# Altium schematic symbol library Resistor - Current Sense.SchLib: 810 symbols (part 3 of 4)
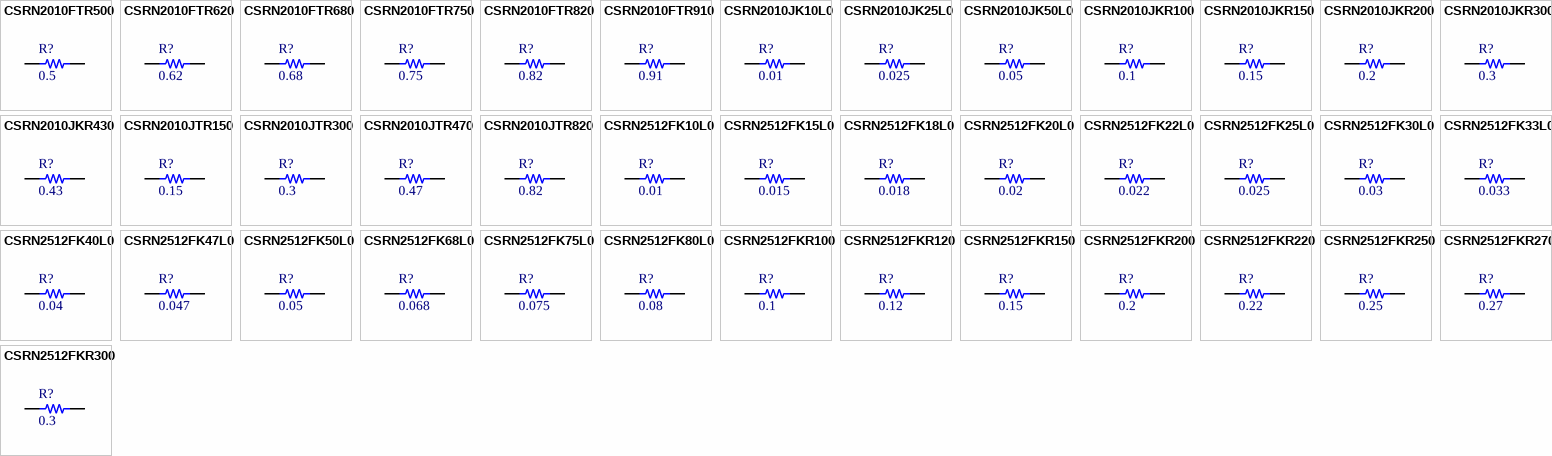
[diagram p22: symbols CSRN2010FTR500 to CSRN2512FKR300]

## CSRN2010FTR500
designator R?, comment 0.5
RES SMD 0.5 OHM 1% 1W 2010; Part Number: CSRN2010FTR500; Manufacturer: Stackpole Electronics Inc.; TemperatureRange: -55C ~ 155C; TemperatureCoefficient: 250ppm/C; Value: 0.5; PartId: 10120; Supplier 1: Digi-Key; Supplier Part Number 1: CSRN2010FTR500-ND; ComponentLink1Description: Datasheet; ComponentLink1URL: http://www.seielect.com/catalog/SEI-CSR_CSRN.pdf; ComponentLink2Description: Digi-Key Listing; ComponentLink2URL: https://www.digikey.com/product-detail/en/stackpole-electronics-inc/CSRN2010FTR500/CSRN2010FTR500-ND/1742703; Tolerance: 1%; PowerRating: 1W; Price: 0.0975; Device Package: 2010 (5025 Metric)
footprint STACKPOLE CSRN2010
pins: 1, 2

## CSRN2010FTR620
designator R?, comment 0.62
RES SMD 0.62 OHM 1% 1W 2010; Part Number: CSRN2010FTR620; Manufacturer: Stackpole Electronics Inc.; TemperatureRange: -55C ~ 155C; TemperatureCoefficient: 250ppm/C; Value: 0.62; PartId: 10121; Supplier 1: Digi-Key; Supplier Part Number 1: CSRN2010FTR620-ND; ComponentLink1Description: Datasheet; ComponentLink1URL: http://www.seielect.com/catalog/SEI-CSR_CSRN.pdf; ComponentLink2Description: Digi-Key Listing; ComponentLink2URL: https://www.digikey.com/product-detail/en/stackpole-electronics-inc/CSRN2010FTR620/CSRN2010FTR620-ND/1742704; Tolerance: 1%; PowerRating: 1W; Price: 0.0975; Device Package: 2010 (5025 Metric)
footprint STACKPOLE CSRN2010
pins: 1, 2

## CSRN2010FTR680
designator R?, comment 0.68
RES SMD 0.68 OHM 1% 1W 2010; Part Number: CSRN2010FTR680; Manufacturer: Stackpole Electronics Inc.; TemperatureRange: -55C ~ 155C; TemperatureCoefficient: 250ppm/C; Value: 0.68; PartId: 10122; Supplier 1: Digi-Key; Supplier Part Number 1: CSRN2010FTR680-ND; ComponentLink1Description: Datasheet; ComponentLink1URL: http://www.seielect.com/catalog/SEI-CSR_CSRN.pdf; ComponentLink2Description: Digi-Key Listing; ComponentLink2URL: https://www.digikey.com/product-detail/en/stackpole-electronics-inc/CSRN2010FTR680/CSRN2010FTR680-ND/1742705; Tolerance: 1%; PowerRating: 1W; Price: 0.0975; Device Package: 2010 (5025 Metric)
footprint STACKPOLE CSRN2010
pins: 1, 2

## CSRN2010FTR750
designator R?, comment 0.75
RES SMD 0.75 OHM 1% 1W 2010; Part Number: CSRN2010FTR750; Manufacturer: Stackpole Electronics Inc.; TemperatureRange: -55C ~ 155C; TemperatureCoefficient: 250ppm/C; Value: 0.75; PartId: 10123; Supplier 1: Digi-Key; Supplier Part Number 1: CSRN2010FTR750-ND; ComponentLink1Description: Datasheet; ComponentLink1URL: http://www.seielect.com/catalog/SEI-CSR_CSRN.pdf; ComponentLink2Description: Digi-Key Listing; ComponentLink2URL: https://www.digikey.com/product-detail/en/stackpole-electronics-inc/CSRN2010FTR750/CSRN2010FTR750-ND/1742706; Tolerance: 1%; PowerRating: 1W; Price: 0.0975; Device Package: 2010 (5025 Metric)
footprint STACKPOLE CSRN2010
pins: 1, 2

## CSRN2010FTR820
designator R?, comment 0.82
RES SMD 0.82 OHM 1% 1W 2010; Part Number: CSRN2010FTR820; Manufacturer: Stackpole Electronics Inc.; TemperatureRange: -55C ~ 155C; TemperatureCoefficient: 250ppm/C; Value: 0.82; PartId: 10124; Supplier 1: Digi-Key; Supplier Part Number 1: CSRN2010FTR820-ND; ComponentLink1Description: Datasheet; ComponentLink1URL: http://www.seielect.com/catalog/SEI-CSR_CSRN.pdf; ComponentLink2Description: Digi-Key Listing; ComponentLink2URL: https://www.digikey.com/product-detail/en/stackpole-electronics-inc/CSRN2010FTR820/CSRN2010FTR820-ND/1742707; Tolerance: 1%; PowerRating: 1W; Price: 0.0975; Device Package: 2010 (5025 Metric)
footprint STACKPOLE CSRN2010
pins: 1, 2

## CSRN2010FTR910
designator R?, comment 0.91
RES SMD 0.91 OHM 1% 1W 2010; Part Number: CSRN2010FTR910; Manufacturer: Stackpole Electronics Inc.; TemperatureRange: -55C ~ 155C; TemperatureCoefficient: 250ppm/C; Value: 0.91; PartId: 10125; Supplier 1: Digi-Key; Supplier Part Number 1: CSRN2010FTR910-ND; ComponentLink1Description: Datasheet; ComponentLink1URL: http://www.seielect.com/catalog/SEI-CSR_CSRN.pdf; ComponentLink2Description: Digi-Key Listing; ComponentLink2URL: https://www.digikey.com/product-detail/en/stackpole-electronics-inc/CSRN2010FTR910/CSRN2010FTR910-ND/1742709; Tolerance: 1%; PowerRating: 1W; Price: 0.0975; Device Package: 2010 (5025 Metric)
footprint STACKPOLE CSRN2010
pins: 1, 2

## CSRN2010JK10L0
designator R?, comment 0.01
RES SMD 0.01 OHM 5% 1W 2010; Part Number: CSRN2010JK10L0; Manufacturer: Stackpole Electronics Inc.; TemperatureRange: -55C ~ 155C; TemperatureCoefficient: 250ppm/C; Value: 0.01; PartId: 10158; Supplier 1: Digi-Key; Supplier Part Number 1: CSRN2010JK10L0-ND; ComponentLink1Description: Datasheet; ComponentLink1URL: http://www.seielect.com/catalog/SEI-CSR_CSRN.pdf; ComponentLink2Description: Digi-Key Listing; ComponentLink2URL: https://www.digikey.com/product-detail/en/stackpole-electronics-inc/CSRN2010JK10L0/CSRN2010JK10L0-ND/1742655; Tolerance: 5%; PowerRating: 1W; Price: 0.1526; Device Package: 2010 (5025 Metric)
footprint STACKPOLE CSRN2010
pins: 1, 2

## CSRN2010JK25L0
designator R?, comment 0.025
RES SMD 0.025 OHM 5% 1W 2010; Part Number: CSRN2010JK25L0; Manufacturer: Stackpole Electronics Inc.; TemperatureRange: -55C ~ 155C; TemperatureCoefficient: 250ppm/C; Value: 0.025; PartId: 10142; Supplier 1: Digi-Key; Supplier Part Number 1: CSRN2010JK25L0-ND; ComponentLink1Description: Datasheet; ComponentLink1URL: http://www.seielect.com/catalog/SEI-CSR_CSRN.pdf; ComponentLink2Description: Digi-Key Listing; ComponentLink2URL: https://www.digikey.com/product-detail/en/stackpole-electronics-inc/CSRN2010JK25L0/CSRN2010JK25L0-ND/1742660; Tolerance: 5%; PowerRating: 1W; Price: 0.126; Device Package: 2010 (5025 Metric)
footprint STACKPOLE CSRN2010
pins: 1, 2

## CSRN2010JK50L0
designator R?, comment 0.05
RES SMD 0.05 OHM 5% 1W 2010; Part Number: CSRN2010JK50L0; Manufacturer: Stackpole Electronics Inc.; TemperatureRange: -55C ~ 155C; TemperatureCoefficient: 250ppm/C; Value: 0.05; PartId: 10143; Supplier 1: Digi-Key; Supplier Part Number 1: CSRN2010JK50L0-ND; ComponentLink1Description: Datasheet; ComponentLink1URL: http://www.seielect.com/catalog/SEI-CSR_CSRN.pdf; ComponentLink2Description: Digi-Key Listing; ComponentLink2URL: https://www.digikey.com/product-detail/en/stackpole-electronics-inc/CSRN2010JK50L0/CSRN2010JK50L0-ND/1742668; Tolerance: 5%; PowerRating: 1W; Price: 0.126; Device Package: 2010 (5025 Metric)
footprint STACKPOLE CSRN2010
pins: 1, 2

## CSRN2010JKR100
designator R?, comment 0.1
RES SMD 0.1 OHM 5% 1W 2010; Part Number: CSRN2010JKR100; Manufacturer: Stackpole Electronics Inc.; TemperatureRange: -55C ~ 155C; TemperatureCoefficient: 250ppm/C; Value: 0.1; PartId: 10127; Supplier 1: Digi-Key; Supplier Part Number 1: CSRN2010JKR100-ND; ComponentLink1Description: Datasheet; ComponentLink1URL: http://www.seielect.com/catalog/SEI-CSR_CSRN.pdf; ComponentLink2Description: Digi-Key Listing; ComponentLink2URL: https://www.digikey.com/product-detail/en/stackpole-electronics-inc/CSRN2010JKR100/CSRN2010JKR100-ND/1742676; Tolerance: 5%; PowerRating: 1W; Price: 0.098; Device Package: 2010 (5025 Metric)
footprint STACKPOLE CSRN2010
pins: 1, 2

## CSRN2010JKR150
designator R?, comment 0.15
RES SMD 0.15 OHM 5% 1W 2010; Part Number: CSRN2010JKR150; Manufacturer: Stackpole Electronics Inc.; TemperatureRange: -55C ~ 155C; TemperatureCoefficient: 250ppm/C; Value: 0.15; PartId: 10116; Supplier 1: Digi-Key; Supplier Part Number 1: CSRN2010JKR150-ND; ComponentLink1Description: Datasheet; ComponentLink1URL: http://www.seielect.com/catalog/SEI-CSR_CSRN.pdf; ComponentLink2Description: Digi-Key Listing; ComponentLink2URL: https://www.digikey.com/product-detail/en/stackpole-electronics-inc/CSRN2010JKR150/CSRN2010JKR150-ND/1742679; Tolerance: 5%; PowerRating: 1W; Price: 0.08; Device Package: 2010 (5025 Metric)
footprint STACKPOLE CSRN2010
pins: 1, 2

## CSRN2010JKR200
designator R?, comment 0.2
RES SMD 0.2 OHM 5% 1W 2010; Part Number: CSRN2010JKR200; Manufacturer: Stackpole Electronics Inc.; TemperatureRange: -55C ~ 155C; TemperatureCoefficient: 250ppm/C; Value: 0.2; PartId: 10117; Supplier 1: Digi-Key; Supplier Part Number 1: CSRN2010JKR200-ND; ComponentLink1Description: Datasheet; ComponentLink1URL: http://www.seielect.com/catalog/SEI-CSR_CSRN.pdf; ComponentLink2Description: Digi-Key Listing; ComponentLink2URL: https://www.digikey.com/product-detail/en/stackpole-electronics-inc/CSRN2010JKR200/CSRN2010JKR200-ND/1742684; Tolerance: 5%; PowerRating: 1W; Price: 0.08; Device Package: 2010 (5025 Metric)
footprint STACKPOLE CSRN2010
pins: 1, 2

## CSRN2010JKR300
designator R?, comment 0.3
RES SMD 0.3 OHM 5% 1W 2010; Part Number: CSRN2010JKR300; Manufacturer: Stackpole Electronics Inc.; TemperatureRange: -55C ~ 155C; TemperatureCoefficient: 250ppm/C; Value: 0.3; PartId: 10118; Supplier 1: Digi-Key; Supplier Part Number 1: CSRN2010JKR300-ND; ComponentLink1Description: Datasheet; ComponentLink1URL: http://www.seielect.com/catalog/SEI-CSR_CSRN.pdf; ComponentLink2Description: Digi-Key Listing; ComponentLink2URL: https://www.digikey.com/product-detail/en/stackpole-electronics-inc/CSRN2010JKR300/CSRN2010JKR300-ND/1742692; Tolerance: 5%; PowerRating: 1W; Price: 0.08; Device Package: 2010 (5025 Metric)
footprint STACKPOLE CSRN2010
pins: 1, 2

## CSRN2010JKR430
designator R?, comment 0.43
RES SMD 0.43 OHM 5% 1W 2010; Part Number: CSRN2010JKR430; Manufacturer: Stackpole Electronics Inc.; TemperatureRange: -55C ~ 155C; TemperatureCoefficient: 250ppm/C; Value: 0.43; PartId: 10119; Supplier 1: Digi-Key; Supplier Part Number 1: CSRN2010JKR430-ND; ComponentLink1Description: Datasheet; ComponentLink1URL: http://www.seielect.com/catalog/SEI-CSR_CSRN.pdf; ComponentLink2Description: Digi-Key Listing; ComponentLink2URL: https://www.digikey.com/product-detail/en/stackpole-electronics-inc/CSRN2010JKR430/CSRN2010JKR430-ND/1742699; Tolerance: 5%; PowerRating: 1W; Price: 0.08; Device Package: 2010 (5025 Metric)
footprint STACKPOLE CSRN2010
pins: 1, 2

## CSRN2010JTR150
designator R?, comment 0.15
RES SMD 0.15 OHM 5% 1W 2010; Part Number: CSRN2010JTR150; Manufacturer: Stackpole Electronics Inc.; TemperatureRange: -55C ~ 155C; TemperatureCoefficient: 250ppm/C; Value: 0.15; PartId: 10113; Supplier 1: Digi-Key; Supplier Part Number 1: CSRN2010JTR150-ND; ComponentLink1Description: Datasheet; ComponentLink1URL: http://www.seielect.com/catalog/SEI-CSR_CSRN.pdf; ComponentLink2Description: Digi-Key Listing; ComponentLink2URL: https://www.digikey.com/product-detail/en/stackpole-electronics-inc/CSRN2010JTR150/CSRN2010JTR150-ND/1742680; Tolerance: 5%; PowerRating: 1W; Price: 0.075; Device Package: 2010 (5025 Metric)
footprint STACKPOLE CSRN2010
pins: 1, 2

## CSRN2010JTR300
designator R?, comment 0.3
RES SMD 0.3 OHM 5% 1W 2010; Part Number: CSRN2010JTR300; Manufacturer: Stackpole Electronics Inc.; TemperatureRange: -55C ~ 155C; TemperatureCoefficient: 250ppm/C; Value: 0.3; PartId: 10114; Supplier 1: Digi-Key; Supplier Part Number 1: CSRN2010JTR300-ND; ComponentLink1Description: Datasheet; ComponentLink1URL: http://www.seielect.com/catalog/SEI-CSR_CSRN.pdf; ComponentLink2Description: Digi-Key Listing; ComponentLink2URL: https://www.digikey.com/product-detail/en/stackpole-electronics-inc/CSRN2010JTR300/CSRN2010JTR300-ND/1742693; Tolerance: 5%; PowerRating: 1W; Price: 0.075; Device Package: 2010 (5025 Metric)
footprint STACKPOLE CSRN2010
pins: 1, 2

## CSRN2010JTR470
designator R?, comment 0.47
RES SMD 0.47 OHM 5% 1W 2010; Part Number: CSRN2010JTR470; Manufacturer: Stackpole Electronics Inc.; TemperatureRange: -55C ~ 155C; TemperatureCoefficient: 250ppm/C; Value: 0.47; PartId: 10115; Supplier 1: Digi-Key; Supplier Part Number 1: CSRN2010JTR470-ND; ComponentLink1Description: Datasheet; ComponentLink1URL: http://www.seielect.com/catalog/SEI-CSR_CSRN.pdf; ComponentLink2Description: Digi-Key Listing; ComponentLink2URL: https://www.digikey.com/product-detail/en/stackpole-electronics-inc/CSRN2010JTR470/CSRN2010JTR470-ND/1742701; Tolerance: 5%; PowerRating: 1W; Price: 0.075; Device Package: 2010 (5025 Metric)
footprint STACKPOLE CSRN2010
pins: 1, 2

## CSRN2010JTR820
designator R?, comment 0.82
RES SMD 0.82 OHM 5% 1W 2010; Part Number: CSRN2010JTR820; Manufacturer: Stackpole Electronics Inc.; TemperatureRange: -55C ~ 155C; TemperatureCoefficient: 250ppm/C; Value: 0.82; PartId: 10112; Supplier 1: Digi-Key; Supplier Part Number 1: CSRN2010JTR820-ND; ComponentLink1Description: Datasheet; ComponentLink1URL: http://www.seielect.com/catalog/SEI-CSR_CSRN.pdf; ComponentLink2Description: Digi-Key Listing; ComponentLink2URL: https://www.digikey.com/product-detail/en/stackpole-electronics-inc/CSRN2010JTR820/CSRN2010JTR820-ND/1742708; Tolerance: 5%; PowerRating: 1W; Price: 0.06; Device Package: 2010 (5025 Metric)
footprint STACKPOLE CSRN2010
pins: 1, 2

## CSRN2512FK10L0
designator R?, comment 0.01
RES SMD 0.01 OHM 1% 2W 2512; Part Number: CSRN2512FK10L0; Manufacturer: Stackpole Electronics Inc.; TemperatureRange: -55C ~ 155C; TemperatureCoefficient: 200ppm/C; Value: 0.01; PartId: 10178; Supplier 1: Digi-Key; Supplier Part Number 1: CSRN2512FK10L0TR-ND; ComponentLink1Description: Datasheet; ComponentLink1URL: http://www.seielect.com/catalog/SEI-CSR_CSRN.pdf; ComponentLink2Description: Digi-Key Listing; ComponentLink2URL: https://www.digikey.com/product-detail/en/stackpole-electronics-inc/CSRN2512FK10L0/CSRN2512FK10L0TR-ND/1646104; Tolerance: 1%; PowerRating: 2W; Price: 0.1925; Device Package: 2512 (6432 Metric)
footprint STACKPOLE CSRN2512
pins: 1, 2

## CSRN2512FK15L0
designator R?, comment 0.015
RES SMD 0.015 OHM 1% 2W 2512; Part Number: CSRN2512FK15L0; Manufacturer: Stackpole Electronics Inc.; TemperatureRange: -55C ~ 155C; TemperatureCoefficient: 200ppm/C; Value: 0.015; PartId: 10181; Supplier 1: Digi-Key; Supplier Part Number 1: CSRN2512FK15L0TR-ND; ComponentLink1Description: Datasheet; ComponentLink1URL: http://www.seielect.com/catalog/SEI-CSR_CSRN.pdf; ComponentLink2Description: Digi-Key Listing; ComponentLink2URL: https://www.digikey.com/product-detail/en/stackpole-electronics-inc/CSRN2512FK15L0/CSRN2512FK15L0TR-ND/1742714; Tolerance: 1%; PowerRating: 2W; Price: 0.1925; Device Package: 2512 (6432 Metric)
footprint STACKPOLE CSRN2512
pins: 1, 2

## CSRN2512FK18L0
designator R?, comment 0.018
RES SMD 0.018 OHM 1% 2W 2512; Part Number: CSRN2512FK18L0; Manufacturer: Stackpole Electronics Inc.; TemperatureRange: -55C ~ 155C; TemperatureCoefficient: 200ppm/C; Value: 0.018; PartId: 10237; Supplier 1: Digi-Key; Supplier Part Number 1: CSRN2512FK18L0-ND; ComponentLink1Description: Datasheet; ComponentLink1URL: http://www.seielect.com/catalog/SEI-CSR_CSRN.pdf; ComponentLink2Description: Digi-Key Listing; ComponentLink2URL: https://www.digikey.com/product-detail/en/stackpole-electronics-inc/CSRN2512FK18L0/CSRN2512FK18L0-ND/1742716; Tolerance: 1%; PowerRating: 2W; Price: 0.1925; Device Package: 2512 (6432 Metric)
footprint STACKPOLE CSRN2512
pins: 1, 2

## CSRN2512FK20L0
designator R?, comment 0.02
RES SMD 0.02 OHM 1% 2W 2512; Part Number: CSRN2512FK20L0; Manufacturer: Stackpole Electronics Inc.; TemperatureRange: -55C ~ 155C; TemperatureCoefficient: 200ppm/C; Value: 0.02; PartId: 10176; Supplier 1: Digi-Key; Supplier Part Number 1: CSRN2512FK20L0TR-ND; ComponentLink1Description: Datasheet; ComponentLink1URL: http://www.seielect.com/catalog/SEI-CSR_CSRN.pdf; ComponentLink2Description: Digi-Key Listing; ComponentLink2URL: https://www.digikey.com/product-detail/en/stackpole-electronics-inc/CSRN2512FK20L0/CSRN2512FK20L0TR-ND/1646105; Tolerance: 1%; PowerRating: 2W; Price: 0.1526; Device Package: 2512 (6432 Metric)
footprint STACKPOLE CSRN2512
pins: 1, 2

## CSRN2512FK22L0
designator R?, comment 0.022
RES SMD 0.022 OHM 1% 2W 2512; Part Number: CSRN2512FK22L0; Manufacturer: Stackpole Electronics Inc.; TemperatureRange: -55C ~ 155C; TemperatureCoefficient: 200ppm/C; Value: 0.022; PartId: 10231; Supplier 1: Digi-Key; Supplier Part Number 1: CSRN2512FK22L0-ND; ComponentLink1Description: Datasheet; ComponentLink1URL: http://www.seielect.com/catalog/SEI-CSR_CSRN.pdf; ComponentLink2Description: Digi-Key Listing; ComponentLink2URL: https://www.digikey.com/product-detail/en/stackpole-electronics-inc/CSRN2512FK22L0/CSRN2512FK22L0-ND/1742721; Tolerance: 1%; PowerRating: 2W; Price: 0.1526; Device Package: 2512 (6432 Metric)
footprint STACKPOLE CSRN2512
pins: 1, 2

## CSRN2512FK25L0
designator R?, comment 0.025
RES SMD 0.025 OHM 1% 2W 2512; Part Number: CSRN2512FK25L0; Manufacturer: Stackpole Electronics Inc.; TemperatureRange: -55C ~ 155C; TemperatureCoefficient: 200ppm/C; Value: 0.025; PartId: 10175; Supplier 1: Digi-Key; Supplier Part Number 1: CSRN2512FK25L0TR-ND; ComponentLink1Description: Datasheet; ComponentLink1URL: http://www.seielect.com/catalog/SEI-CSR_CSRN.pdf; ComponentLink2Description: Digi-Key Listing; ComponentLink2URL: https://www.digikey.com/product-detail/en/stackpole-electronics-inc/CSRN2512FK25L0/CSRN2512FK25L0TR-ND/1646106; Tolerance: 1%; PowerRating: 2W; Price: 0.1526; Device Package: 2512 (6432 Metric)
footprint STACKPOLE CSRN2512
pins: 1, 2

## CSRN2512FK30L0
designator R?, comment 0.03
RES SMD 0.03 OHM 1% 2W 2512; Part Number: CSRN2512FK30L0; Manufacturer: Stackpole Electronics Inc.; TemperatureRange: -55C ~ 155C; TemperatureCoefficient: 200ppm/C; Value: 0.03; PartId: 10174; Supplier 1: Digi-Key; Supplier Part Number 1: CSRN2512FK30L0TR-ND; ComponentLink1Description: Datasheet; ComponentLink1URL: http://www.seielect.com/catalog/SEI-CSR_CSRN.pdf; ComponentLink2Description: Digi-Key Listing; ComponentLink2URL: https://www.digikey.com/product-detail/en/stackpole-electronics-inc/CSRN2512FK30L0/CSRN2512FK30L0TR-ND/1646107; Tolerance: 1%; PowerRating: 2W; Price: 0.1526; Device Package: 2512 (6432 Metric)
footprint STACKPOLE CSRN2512
pins: 1, 2

## CSRN2512FK33L0
designator R?, comment 0.033
RES SMD 0.033 OHM 1% 2W 2512; Part Number: CSRN2512FK33L0; Manufacturer: Stackpole Electronics Inc.; TemperatureRange: -55C ~ 155C; TemperatureCoefficient: 200ppm/C; Value: 0.033; PartId: 10232; Supplier 1: Digi-Key; Supplier Part Number 1: CSRN2512FK33L0-ND; ComponentLink1Description: Datasheet; ComponentLink1URL: http://www.seielect.com/catalog/SEI-CSR_CSRN.pdf; ComponentLink2Description: Digi-Key Listing; ComponentLink2URL: https://www.digikey.com/product-detail/en/stackpole-electronics-inc/CSRN2512FK33L0/CSRN2512FK33L0-ND/1742724; Tolerance: 1%; PowerRating: 2W; Price: 0.1526; Device Package: 2512 (6432 Metric)
footprint STACKPOLE CSRN2512
pins: 1, 2

## CSRN2512FK40L0
designator R?, comment 0.04
RES SMD 0.04 OHM 1% 2W 2512; Part Number: CSRN2512FK40L0; Manufacturer: Stackpole Electronics Inc.; TemperatureRange: -55C ~ 155C; TemperatureCoefficient: 200ppm/C; Value: 0.04; PartId: 10177; Supplier 1: Digi-Key; Supplier Part Number 1: CSRN2512FK40L0TR-ND; ComponentLink1Description: Datasheet; ComponentLink1URL: http://www.seielect.com/catalog/SEI-CSR_CSRN.pdf; ComponentLink2Description: Digi-Key Listing; ComponentLink2URL: https://www.digikey.com/product-detail/en/stackpole-electronics-inc/CSRN2512FK40L0/CSRN2512FK40L0TR-ND/1788108; Tolerance: 1%; PowerRating: 2W; Price: 0.1526; Device Package: 2512 (6432 Metric)
footprint STACKPOLE CSRN2512
pins: 1, 2

## CSRN2512FK47L0
designator R?, comment 0.047
RES SMD 0.047 OHM 1% 2W 2512; Part Number: CSRN2512FK47L0; Manufacturer: Stackpole Electronics Inc.; TemperatureRange: -55C ~ 155C; TemperatureCoefficient: 200ppm/C; Value: 0.047; PartId: 10233; Supplier 1: Digi-Key; Supplier Part Number 1: CSRN2512FK47L0-ND; ComponentLink1Description: Datasheet; ComponentLink1URL: http://www.seielect.com/catalog/SEI-CSR_CSRN.pdf; ComponentLink2Description: Digi-Key Listing; ComponentLink2URL: https://www.digikey.com/product-detail/en/stackpole-electronics-inc/CSRN2512FK47L0/CSRN2512FK47L0-ND/1742731; Tolerance: 1%; PowerRating: 2W; Price: 0.1526; Device Package: 2512 (6432 Metric)
footprint STACKPOLE CSRN2512
pins: 1, 2

## CSRN2512FK50L0
designator R?, comment 0.05
RES SMD 0.05 OHM 1% 2W 2512; Part Number: CSRN2512FK50L0; Manufacturer: Stackpole Electronics Inc.; TemperatureRange: -55C ~ 155C; TemperatureCoefficient: 200ppm/C; Value: 0.05; PartId: 10173; Supplier 1: Digi-Key; Supplier Part Number 1: CSRN2512FK50L0TR-ND; ComponentLink1Description: Datasheet; ComponentLink1URL: http://www.seielect.com/catalog/SEI-CSR_CSRN.pdf; ComponentLink2Description: Digi-Key Listing; ComponentLink2URL: https://www.digikey.com/product-detail/en/stackpole-electronics-inc/CSRN2512FK50L0/CSRN2512FK50L0TR-ND/1646108; Tolerance: 1%; PowerRating: 2W; Price: 0.1388; Device Package: 2512 (6432 Metric)
footprint STACKPOLE CSRN2512
pins: 1, 2

## CSRN2512FK68L0
designator R?, comment 0.068
RES SMD 0.068 OHM 1% 2W 2512; Part Number: CSRN2512FK68L0; Manufacturer: Stackpole Electronics Inc.; TemperatureRange: -55C ~ 155C; TemperatureCoefficient: 200ppm/C; Value: 0.068; PartId: 10180; Supplier 1: Digi-Key; Supplier Part Number 1: CSRN2512FK68L0TR-ND; ComponentLink1Description: Datasheet; ComponentLink1URL: http://www.seielect.com/catalog/SEI-CSR_CSRN.pdf; ComponentLink2Description: Digi-Key Listing; ComponentLink2URL: https://www.digikey.com/product-detail/en/stackpole-electronics-inc/CSRN2512FK68L0/CSRN2512FK68L0TR-ND/1742736; Tolerance: 1%; PowerRating: 2W; Price: 0.1388; Device Package: 2512 (6432 Metric)
footprint STACKPOLE CSRN2512
pins: 1, 2

## CSRN2512FK75L0
designator R?, comment 0.075
RES SMD 0.075 OHM 1% 2W 2512; Part Number: CSRN2512FK75L0; Manufacturer: Stackpole Electronics Inc.; TemperatureRange: -55C ~ 155C; TemperatureCoefficient: 200ppm/C; Value: 0.075; PartId: 10182; Supplier 1: Digi-Key; Supplier Part Number 1: CSRN2512FK75L0TR-ND; ComponentLink1Description: Datasheet; ComponentLink1URL: http://www.seielect.com/catalog/SEI-CSR_CSRN.pdf; ComponentLink2Description: Digi-Key Listing; ComponentLink2URL: https://www.digikey.com/product-detail/en/stackpole-electronics-inc/CSRN2512FK75L0/CSRN2512FK75L0TR-ND/1646109; Tolerance: 1%; PowerRating: 2W; Price: 0.1388; Device Package: 2512 (6432 Metric)
footprint STACKPOLE CSRN2512
pins: 1, 2

## CSRN2512FK80L0
designator R?, comment 0.08
RES SMD 0.08 OHM 1% 2W 2512; Part Number: CSRN2512FK80L0; Manufacturer: Stackpole Electronics Inc.; TemperatureRange: -55C ~ 155C; TemperatureCoefficient: 200ppm/C; Value: 0.08; PartId: 10223; Supplier 1: Digi-Key; Supplier Part Number 1: CSRN2512FK80L0-ND; ComponentLink1Description: Datasheet; ComponentLink1URL: http://www.seielect.com/catalog/SEI-CSR_CSRN.pdf; ComponentLink2Description: Digi-Key Listing; ComponentLink2URL: https://www.digikey.com/product-detail/en/stackpole-electronics-inc/CSRN2512FK80L0/CSRN2512FK80L0-ND/1742739; Tolerance: 1%; PowerRating: 2W; Price: 0.1388; Device Package: 2512 (6432 Metric)
footprint STACKPOLE CSRN2512
pins: 1, 2

## CSRN2512FKR100
designator R?, comment 0.1
RES SMD 0.1 OHM 1% 2W 2512; Part Number: CSRN2512FKR100; Manufacturer: Stackpole Electronics Inc.; TemperatureRange: -55C ~ 155C; TemperatureCoefficient: 200ppm/C; Value: 0.1; PartId: 10172; Supplier 1: Digi-Key; Supplier Part Number 1: CSRN2512FKR100TR-ND; ComponentLink1Description: Datasheet; ComponentLink1URL: http://www.seielect.com/catalog/SEI-CSR_CSRN.pdf; ComponentLink2Description: Digi-Key Listing; ComponentLink2URL: https://www.digikey.com/product-detail/en/stackpole-electronics-inc/CSRN2512FKR100/CSRN2512FKR100TR-ND/1646110; Tolerance: 1%; PowerRating: 2W; Price: 0.126; Device Package: 2512 (6432 Metric)
footprint STACKPOLE CSRN2512
pins: 1, 2

## CSRN2512FKR120
designator R?, comment 0.12
RES SMD 0.12 OHM 1% 2W 2512; Part Number: CSRN2512FKR120; Manufacturer: Stackpole Electronics Inc.; TemperatureRange: -55C ~ 155C; TemperatureCoefficient: 200ppm/C; Value: 0.12; PartId: 10213; Supplier 1: Digi-Key; Supplier Part Number 1: CSRN2512FKR120-ND; ComponentLink1Description: Datasheet; ComponentLink1URL: http://www.seielect.com/catalog/SEI-CSR_CSRN.pdf; ComponentLink2Description: Digi-Key Listing; ComponentLink2URL: https://www.digikey.com/product-detail/en/stackpole-electronics-inc/CSRN2512FKR120/CSRN2512FKR120-ND/1742742; Tolerance: 1%; PowerRating: 2W; Price: 0.126; Device Package: 2512 (6432 Metric)
footprint STACKPOLE CSRN2512
pins: 1, 2

## CSRN2512FKR150
designator R?, comment 0.15
RES SMD 0.15 OHM 1% 2W 2512; Part Number: CSRN2512FKR150; Manufacturer: Stackpole Electronics Inc.; TemperatureRange: -55C ~ 155C; TemperatureCoefficient: 200ppm/C; Value: 0.15; PartId: 10167; Supplier 1: Digi-Key; Supplier Part Number 1: CSRN2512FKR150TR-ND; ComponentLink1Description: Datasheet; ComponentLink1URL: http://www.seielect.com/catalog/SEI-CSR_CSRN.pdf; ComponentLink2Description: Digi-Key Listing; ComponentLink2URL: https://www.digikey.com/product-detail/en/stackpole-electronics-inc/CSRN2512FKR150/CSRN2512FKR150TR-ND/1788109; Tolerance: 1%; PowerRating: 2W; Price: 0.126; Device Package: 2512 (6432 Metric)
footprint STACKPOLE CSRN2512
pins: 1, 2

## CSRN2512FKR200
designator R?, comment 0.2
RES SMD 0.2 OHM 1% 2W 2512; Part Number: CSRN2512FKR200; Manufacturer: Stackpole Electronics Inc.; TemperatureRange: -55C ~ 155C; TemperatureCoefficient: 200ppm/C; Value: 0.2; PartId: 10168; Supplier 1: Digi-Key; Supplier Part Number 1: CSRN2512FKR200TR-ND; ComponentLink1Description: Datasheet; ComponentLink1URL: http://www.seielect.com/catalog/SEI-CSR_CSRN.pdf; ComponentLink2Description: Digi-Key Listing; ComponentLink2URL: https://www.digikey.com/product-detail/en/stackpole-electronics-inc/CSRN2512FKR200/CSRN2512FKR200TR-ND/1742748; Tolerance: 1%; PowerRating: 2W; Price: 0.126; Device Package: 2512 (6432 Metric)
footprint STACKPOLE CSRN2512
pins: 1, 2

## CSRN2512FKR220
designator R?, comment 0.22
RES SMD 0.22 OHM 1% 2W 2512; Part Number: CSRN2512FKR220; Manufacturer: Stackpole Electronics Inc.; TemperatureRange: -55C ~ 155C; TemperatureCoefficient: 200ppm/C; Value: 0.22; PartId: 10214; Supplier 1: Digi-Key; Supplier Part Number 1: CSRN2512FKR220-ND; ComponentLink1Description: Datasheet; ComponentLink1URL: http://www.seielect.com/catalog/SEI-CSR_CSRN.pdf; ComponentLink2Description: Digi-Key Listing; ComponentLink2URL: https://www.digikey.com/product-detail/en/stackpole-electronics-inc/CSRN2512FKR220/CSRN2512FKR220-ND/1742750; Tolerance: 1%; PowerRating: 2W; Price: 0.126; Device Package: 2512 (6432 Metric)
footprint STACKPOLE CSRN2512
pins: 1, 2

## CSRN2512FKR250
designator R?, comment 0.25
RES SMD 0.25 OHM 1% 2W 2512; Part Number: CSRN2512FKR250; Manufacturer: Stackpole Electronics Inc.; TemperatureRange: -55C ~ 155C; TemperatureCoefficient: 200ppm/C; Value: 0.25; PartId: 10166; Supplier 1: Digi-Key; Supplier Part Number 1: CSRN2512FKR250TR-ND; ComponentLink1Description: Datasheet; ComponentLink1URL: http://www.seielect.com/catalog/SEI-CSR_CSRN.pdf; ComponentLink2Description: Digi-Key Listing; ComponentLink2URL: https://www.digikey.com/product-detail/en/stackpole-electronics-inc/CSRN2512FKR250/CSRN2512FKR250TR-ND/1788110; Tolerance: 1%; PowerRating: 2W; Price: 0.126; Device Package: 2512 (6432 Metric)
footprint STACKPOLE CSRN2512
pins: 1, 2

## CSRN2512FKR270
designator R?, comment 0.27
RES SMD 0.27 OHM 1% 2W 2512; Part Number: CSRN2512FKR270; Manufacturer: Stackpole Electronics Inc.; TemperatureRange: -55C ~ 155C; TemperatureCoefficient: 200ppm/C; Value: 0.27; PartId: 10215; Supplier 1: Digi-Key; Supplier Part Number 1: CSRN2512FKR270-ND; ComponentLink1Description: Datasheet; ComponentLink1URL: http://www.seielect.com/catalog/SEI-CSR_CSRN.pdf; ComponentLink2Description: Digi-Key Listing; ComponentLink2URL: https://www.digikey.com/product-detail/en/stackpole-electronics-inc/CSRN2512FKR270/CSRN2512FKR270-ND/1742752; Tolerance: 1%; PowerRating: 2W; Price: 0.126; Device Package: 2512 (6432 Metric)
footprint STACKPOLE CSRN2512
pins: 1, 2

## CSRN2512FKR300
designator R?, comment 0.3
RES SMD 0.3 OHM 1% 2W 2512; Part Number: CSRN2512FKR300; Manufacturer: Stackpole Electronics Inc.; TemperatureRange: -55C ~ 155C; TemperatureCoefficient: 200ppm/C; Value: 0.3; PartId: 10169; Supplier 1: Digi-Key; Supplier Part Number 1: CSRN2512FKR300TR-ND; ComponentLink1Description: Datasheet; ComponentLink1URL: http://www.seielect.com/catalog/SEI-CSR_CSRN.pdf; ComponentLink2Description: Digi-Key Listing; ComponentLink2URL: https://www.digikey.com/product-detail/en/stackpole-electronics-inc/CSRN2512FKR300/CSRN2512FKR300TR-ND/1742753; Tolerance: 1%; PowerRating: 2W; Price: 0.126; Device Package: 2512 (6432 Metric)
footprint STACKPOLE CSRN2512
pins: 1, 2

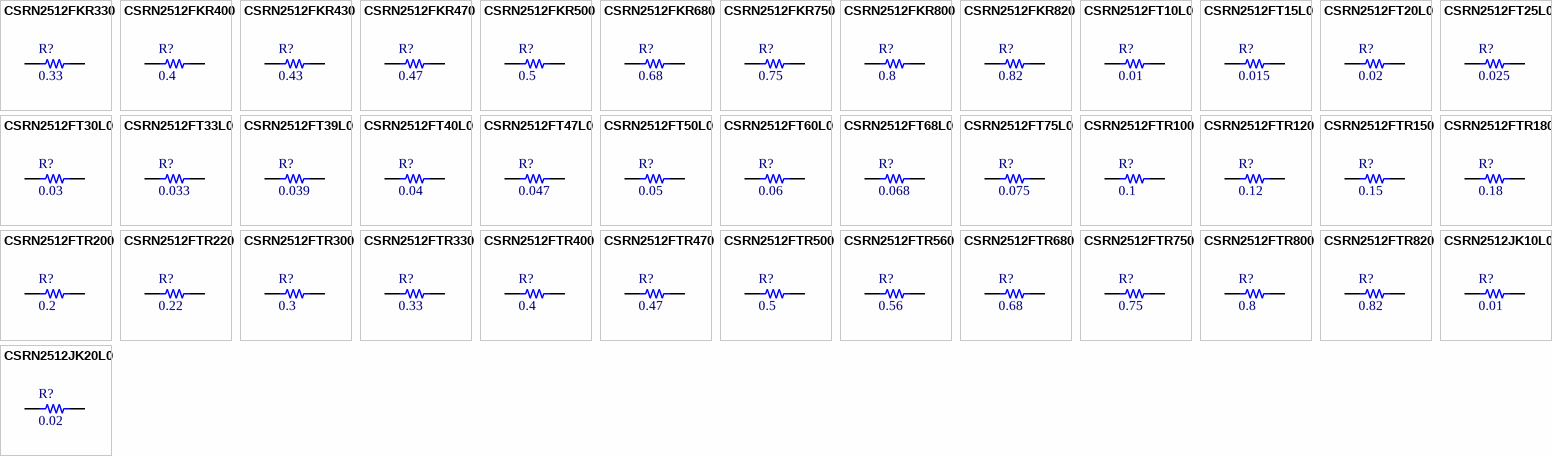
[diagram p11: symbols CSRN2512FKR330 to CSRN2512JK20L0]

## CSRN2512FKR330
designator R?, comment 0.33
RES SMD 0.33 OHM 1% 2W 2512; Part Number: CSRN2512FKR330; Manufacturer: Stackpole Electronics Inc.; TemperatureRange: -55C ~ 155C; TemperatureCoefficient: 200ppm/C; Value: 0.33; PartId: 10171; Supplier 1: Digi-Key; Supplier Part Number 1: CSRN2512FKR330TR-ND; ComponentLink1Description: Datasheet; ComponentLink1URL: http://www.seielect.com/catalog/SEI-CSR_CSRN.pdf; ComponentLink2Description: Digi-Key Listing; ComponentLink2URL: https://www.digikey.com/product-detail/en/stackpole-electronics-inc/CSRN2512FKR330/CSRN2512FKR330TR-ND/1742756; Tolerance: 1%; PowerRating: 2W; Price: 0.126; Device Package: 2512 (6432 Metric)
footprint STACKPOLE CSRN2512
pins: 1, 2

## CSRN2512FKR400
designator R?, comment 0.4
RES SMD 0.4 OHM 1% 2W 2512; Part Number: CSRN2512FKR400; Manufacturer: Stackpole Electronics Inc.; TemperatureRange: -55C ~ 155C; TemperatureCoefficient: 200ppm/C; Value: 0.4; PartId: 10179; Supplier 1: Digi-Key; Supplier Part Number 1: CSRN2512FKR400TR-ND; ComponentLink1Description: Datasheet; ComponentLink1URL: http://www.seielect.com/catalog/SEI-CSR_CSRN.pdf; ComponentLink2Description: Digi-Key Listing; ComponentLink2URL: https://www.digikey.com/product-detail/en/stackpole-electronics-inc/CSRN2512FKR400/CSRN2512FKR400TR-ND/1788111; Tolerance: 1%; PowerRating: 2W; Price: 0.126; Device Package: 2512 (6432 Metric)
footprint STACKPOLE CSRN2512
pins: 1, 2

## CSRN2512FKR430
designator R?, comment 0.43
RES SMD 0.43 OHM 1% 2W 2512; Part Number: CSRN2512FKR430; Manufacturer: Stackpole Electronics Inc.; TemperatureRange: -55C ~ 155C; TemperatureCoefficient: 200ppm/C; Value: 0.43; PartId: 10216; Supplier 1: Digi-Key; Supplier Part Number 1: CSRN2512FKR430-ND; ComponentLink1Description: Datasheet; ComponentLink1URL: http://www.seielect.com/catalog/SEI-CSR_CSRN.pdf; ComponentLink2Description: Digi-Key Listing; ComponentLink2URL: https://www.digikey.com/product-detail/en/stackpole-electronics-inc/CSRN2512FKR430/CSRN2512FKR430-ND/1742763; Tolerance: 1%; PowerRating: 2W; Price: 0.126; Device Package: 2512 (6432 Metric)
footprint STACKPOLE CSRN2512
pins: 1, 2

## CSRN2512FKR470
designator R?, comment 0.47
RES SMD 0.47 OHM 1% 2W 2512; Part Number: CSRN2512FKR470; Manufacturer: Stackpole Electronics Inc.; TemperatureRange: -55C ~ 155C; TemperatureCoefficient: 200ppm/C; Value: 0.47; PartId: 10170; Supplier 1: Digi-Key; Supplier Part Number 1: CSRN2512FKR470TR-ND; ComponentLink1Description: Datasheet; ComponentLink1URL: http://www.seielect.com/catalog/SEI-CSR_CSRN.pdf; ComponentLink2Description: Digi-Key Listing; ComponentLink2URL: https://www.digikey.com/product-detail/en/stackpole-electronics-inc/CSRN2512FKR470/CSRN2512FKR470TR-ND/1788112; Tolerance: 1%; PowerRating: 2W; Price: 0.126; Device Package: 2512 (6432 Metric)
footprint STACKPOLE CSRN2512
pins: 1, 2

## CSRN2512FKR500
designator R?, comment 0.5
RES SMD 0.5 OHM 1% 2W 2512; Part Number: CSRN2512FKR500; Manufacturer: Stackpole Electronics Inc.; TemperatureRange: -55C ~ 155C; TemperatureCoefficient: 200ppm/C; Value: 0.5; PartId: 10163; Supplier 1: Digi-Key; Supplier Part Number 1: CSRN2512FKR500TR-ND; ComponentLink1Description: Datasheet; ComponentLink1URL: http://www.seielect.com/catalog/SEI-CSR_CSRN.pdf; ComponentLink2Description: Digi-Key Listing; ComponentLink2URL: https://www.digikey.com/product-detail/en/stackpole-electronics-inc/CSRN2512FKR500/CSRN2512FKR500TR-ND/1742768; Tolerance: 1%; PowerRating: 2W; Price: 0.088; Device Package: 2512 (6432 Metric)
footprint STACKPOLE CSRN2512
pins: 1, 2

## CSRN2512FKR680
designator R?, comment 0.68
RES SMD 0.68 OHM 1% 2W 2512; Part Number: CSRN2512FKR680; Manufacturer: Stackpole Electronics Inc.; TemperatureRange: -55C ~ 155C; TemperatureCoefficient: 200ppm/C; Value: 0.68; PartId: 10162; Supplier 1: Digi-Key; Supplier Part Number 1: CSRN2512FKR680TR-ND; ComponentLink1Description: Datasheet; ComponentLink1URL: http://www.seielect.com/catalog/SEI-CSR_CSRN.pdf; ComponentLink2Description: Digi-Key Listing; ComponentLink2URL: https://www.digikey.com/product-detail/en/stackpole-electronics-inc/CSRN2512FKR680/CSRN2512FKR680TR-ND/1788113; Tolerance: 1%; PowerRating: 2W; Price: 0.088; Device Package: 2512 (6432 Metric)
footprint STACKPOLE CSRN2512
pins: 1, 2

## CSRN2512FKR750
designator R?, comment 0.75
RES SMD 0.75 OHM 1% 2W 2512; Part Number: CSRN2512FKR750; Manufacturer: Stackpole Electronics Inc.; TemperatureRange: -55C ~ 155C; TemperatureCoefficient: 200ppm/C; Value: 0.75; PartId: 10164; Supplier 1: Digi-Key; Supplier Part Number 1: CSRN2512FKR750TR-ND; ComponentLink1Description: Datasheet; ComponentLink1URL: http://www.seielect.com/catalog/SEI-CSR_CSRN.pdf; ComponentLink2Description: Digi-Key Listing; ComponentLink2URL: https://www.digikey.com/product-detail/en/stackpole-electronics-inc/CSRN2512FKR750/CSRN2512FKR750TR-ND/1788114; Tolerance: 1%; PowerRating: 2W; Price: 0.088; Device Package: 2512 (6432 Metric)
footprint STACKPOLE CSRN2512
pins: 1, 2

## CSRN2512FKR800
designator R?, comment 0.8
RES SMD 0.8 OHM 1% 2W 2512; Part Number: CSRN2512FKR800; Manufacturer: Stackpole Electronics Inc.; TemperatureRange: -55C ~ 155C; TemperatureCoefficient: 200ppm/C; Value: 0.8; PartId: 10189; Supplier 1: Digi-Key; Supplier Part Number 1: CSRN2512FKR800-ND; ComponentLink1Description: Datasheet; ComponentLink1URL: http://www.seielect.com/catalog/SEI-CSR_CSRN.pdf; ComponentLink2Description: Digi-Key Listing; ComponentLink2URL: https://www.digikey.com/product-detail/en/stackpole-electronics-inc/CSRN2512FKR800/CSRN2512FKR800-ND/1742773; Tolerance: 1%; PowerRating: 2W; Price: 0.088; Device Package: 2512 (6432 Metric)
footprint STACKPOLE CSRN2512
pins: 1, 2

## CSRN2512FKR820
designator R?, comment 0.82
RES SMD 0.82 OHM 1% 2W 2512; Part Number: CSRN2512FKR820; Manufacturer: Stackpole Electronics Inc.; TemperatureRange: -55C ~ 155C; TemperatureCoefficient: 200ppm/C; Value: 0.82; PartId: 10190; Supplier 1: Digi-Key; Supplier Part Number 1: CSRN2512FKR820-ND; ComponentLink1Description: Datasheet; ComponentLink1URL: http://www.seielect.com/catalog/SEI-CSR_CSRN.pdf; ComponentLink2Description: Digi-Key Listing; ComponentLink2URL: https://www.digikey.com/product-detail/en/stackpole-electronics-inc/CSRN2512FKR820/CSRN2512FKR820-ND/1742775; Tolerance: 1%; PowerRating: 2W; Price: 0.088; Device Package: 2512 (6432 Metric)
footprint STACKPOLE CSRN2512
pins: 1, 2

## CSRN2512FT10L0
designator R?, comment 0.01